# Altium schematic symbol library jlcpcb_2025_04_capacitors_extended_0805.schlib: 3281 symbols (part 14 of 18) (continued)
## FV21X472K102ECG
designator C?  Capacitance: 4.7nF  (hidden comment: *)
Capacitor, Ceramic (MLCC), 4.7nF, ±10%, 1kV, X7R, ±10%, SMD 0805; Manufacturer: PSA(Prosperity Dielectrics); Manufacturer Part Number: FV21X472K102ECG; Package Size: 0805; JLCPCB Basic Part: No; JLCPCB Part Number: C565695; Supplier 1: LCSC; Category: Capacitors - MLCC; Supplier Part Number 1: C565695; Tolerance: ±10%; Voltage Rating: 1kV; Temperature Coefficient: X7R; RoHS: Yes; ComponentLink1Description: Datasheet; ComponentLink1URL: https://wmsc.lcsc.com/wmsc/upload/file/pdf/v2/lcsc/2304140030_PSA-Prosperity-Dielectrics-FV21X472K102ECG_C565695.pdf; ComponentLink2Description: JLCPCB Part URL; ComponentLink2URL: https://jlcpcb.com/partdetail/C565695; ComponentLink3Description: LCSC Part URL; ComponentLink3URL: https://lcsc.com/product-detail/Multilayer-Ceramic-Capacitors-MLCC---SMD-SMT_PSAProsperity-Dielectrics-PSAProsperity-Dielectrics-FV21X472K102ECG_C565695.html
footprint CAP-0805 (0805 (2012M) Capacitor)
pins: 1, 2

## GCD21BR71H104KA01L
designator C?  Capacitance: 100nF  (hidden comment: *)
Capacitor, Ceramic (MLCC), 100nF, ±10%, null, X7R, ±10%, SMD 0805; Manufacturer: Murata Electronics; Manufacturer Part Number: GCD21BR71H104KA01L; Package Size: 0805; JLCPCB Basic Part: No; JLCPCB Part Number: C882587; Supplier 1: LCSC; Category: Capacitors - MLCC; Supplier Part Number 1: C882587; Tolerance: ±10%; Voltage Rating: null; Temperature Coefficient: X7R; RoHS: Yes; ComponentLink1Description: Datasheet; ComponentLink1URL: https://wmsc.lcsc.com/wmsc/upload/file/pdf/v2/lcsc/2201242130_Murata-Electronics-GCD21BR71H104KA01L_C882587.pdf; ComponentLink2Description: JLCPCB Part URL; ComponentLink2URL: https://jlcpcb.com/partdetail/C882587; ComponentLink3Description: LCSC Part URL; ComponentLink3URL: https://lcsc.com/product-detail/Multilayer-Ceramic-Capacitors-MLCC---SMD-SMT_Murata-Electronics-Murata-Electronics-GCD21BR71H104KA01L_C882587.html
footprint CAP-0805 (0805 (2012M) Capacitor)
pins: 1, 2

## GCD21BR72A104KA01L
designator C?  Capacitance: 100nF  (hidden comment: *)
Capacitor, Ceramic (MLCC), 100nF, ±10%, 100V, X7R, ±10%, SMD 0805; Manufacturer: Murata Electronics; Manufacturer Part Number: GCD21BR72A104KA01L; Package Size: 0805; JLCPCB Basic Part: No; JLCPCB Part Number: C2169476; Supplier 1: LCSC; Category: Capacitors - MLCC; Supplier Part Number 1: C2169476; Tolerance: ±10%; Voltage Rating: 100V; Temperature Coefficient: X7R; RoHS: Yes; ComponentLink1Description: Datasheet; ComponentLink1URL: https://wmsc.lcsc.com/wmsc/upload/file/pdf/v2/lcsc/2202040400_Murata-Electronics-GCD21BR72A104KA01L_C2169476.pdf; ComponentLink2Description: JLCPCB Part URL; ComponentLink2URL: https://jlcpcb.com/partdetail/C2169476; ComponentLink3Description: LCSC Part URL; ComponentLink3URL: https://lcsc.com/product-detail/Multilayer-Ceramic-Capacitors-MLCC---SMD-SMT_Murata-Electronics-Murata-Electronics-GCD21BR72A104KA01L_C2169476.html
footprint CAP-0805 (0805 (2012M) Capacitor)
pins: 1, 2

## GCG219R91H223KA03D
designator C?  Capacitance: 22nF  (hidden comment: *)
Capacitor, Ceramic (MLCC), 22nF, ±10%, 50V, X8R, ±10%, SMD 0805; Manufacturer: Murata Electronics; Manufacturer Part Number: GCG219R91H223KA03D; Package Size: 0805; JLCPCB Basic Part: No; JLCPCB Part Number: C161111; Supplier 1: LCSC; Category: Capacitors - MLCC; Supplier Part Number 1: C161111; Tolerance: ±10%; Voltage Rating: 50V; Temperature Coefficient: X8R; RoHS: Yes; ComponentLink1Description: Datasheet; ComponentLink1URL: https://wmsc.lcsc.com/wmsc/upload/file/pdf/v2/lcsc/1810201330_Murata-Electronics-GCG219R91H223KA03D_C161111.pdf; ComponentLink2Description: JLCPCB Part URL; ComponentLink2URL: https://jlcpcb.com/partdetail/C161111; ComponentLink3Description: LCSC Part URL; ComponentLink3URL: https://lcsc.com/product-detail/Multilayer-Ceramic-Capacitors-MLCC---SMD-SMT_Murata-Electronics-Murata-Electronics-GCG219R91H223KA03D_C161111.html
footprint CAP-0805 (0805 (2012M) Capacitor)
pins: 1, 2

## GCJ21AR72E472KXJ1D
designator C?  Capacitance: 4.7nF  (hidden comment: *)
Capacitor, Ceramic (MLCC), 4.7nF, ±10%, 250V, X7R, ±10%, SMD 0805; Manufacturer: Murata Electronics; Manufacturer Part Number: GCJ21AR72E472KXJ1D; Package Size: 0805; JLCPCB Basic Part: No; JLCPCB Part Number: C710625; Supplier 1: LCSC; Category: Capacitors - MLCC; Supplier Part Number 1: C710625; Tolerance: ±10%; Voltage Rating: 250V; Temperature Coefficient: X7R; RoHS: Yes; ComponentLink1Description: Datasheet; ComponentLink1URL: https://wmsc.lcsc.com/wmsc/upload/file/pdf/v2/lcsc/2206301900_Murata-Electronics-GCJ21AR72E472KXJ1D_C710625.pdf; ComponentLink2Description: JLCPCB Part URL; ComponentLink2URL: https://jlcpcb.com/partdetail/C710625; ComponentLink3Description: LCSC Part URL; ComponentLink3URL: https://lcsc.com/product-detail/Multilayer-Ceramic-Capacitors-MLCC---SMD-SMT_Murata-Electronics-Murata-Electronics-GCJ21AR72E472KXJ1D_C710625.html
footprint CAP-0805 (0805 (2012M) Capacitor)
pins: 1, 2

## GCJ21BC72A105KE02L
designator C?  Capacitance: 1uF  (hidden comment: *)
Capacitor, Ceramic (MLCC), 1uF, ±10%, 100V, X7S, ±10%, SMD 0805; Manufacturer: Murata Electronics; Manufacturer Part Number: GCJ21BC72A105KE02L; Package Size: 0805; JLCPCB Basic Part: No; JLCPCB Part Number: C524548; Supplier 1: LCSC; Category: Capacitors - MLCC; Supplier Part Number 1: C524548; Tolerance: ±10%; Voltage Rating: 100V; Temperature Coefficient: X7S; RoHS: Yes; ComponentLink1Description: Datasheet; ComponentLink1URL: https://wmsc.lcsc.com/wmsc/upload/file/pdf/v2/lcsc/2007231106_Murata-Electronics-GCJ21BC72A105KE02L_C524548.pdf; ComponentLink2Description: JLCPCB Part URL; ComponentLink2URL: https://jlcpcb.com/partdetail/C524548; ComponentLink3Description: LCSC Part URL; ComponentLink3URL: https://lcsc.com/product-detail/Multilayer-Ceramic-Capacitors-MLCC---SMD-SMT_Murata-Electronics-Murata-Electronics-GCJ21BC72A105KE02L_C524548.html
footprint CAP-0805 (0805 (2012M) Capacitor)
pins: 1, 2

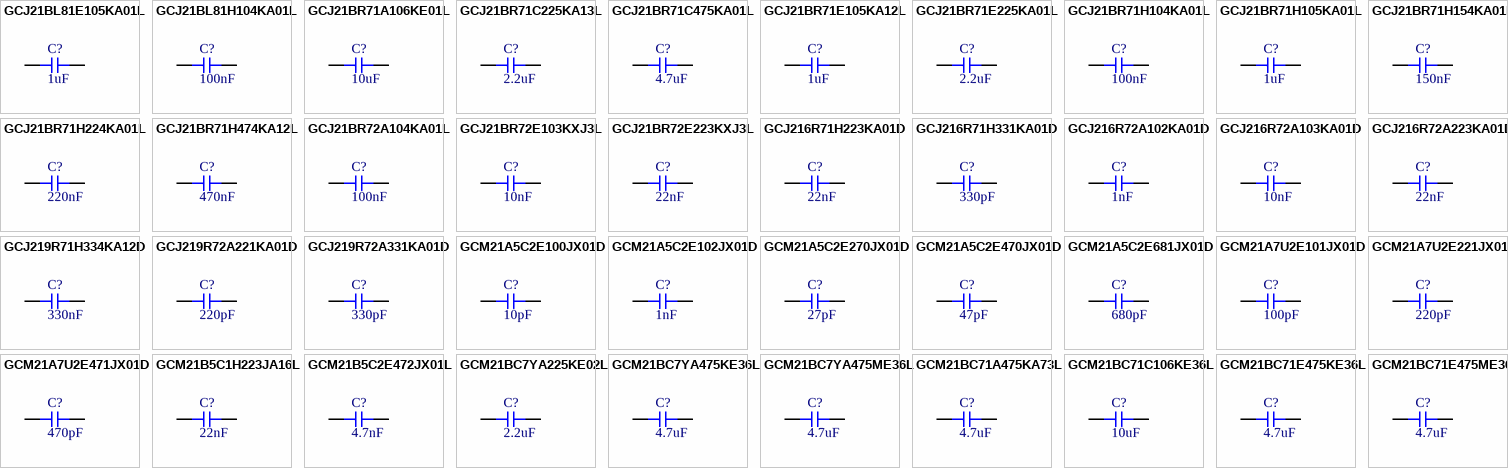
[diagram p61: symbols GCJ21BL81E105KA01L to GCM21BC71E475ME36L]

## GCJ21BL81E105KA01L
designator C?  Capacitance: 1uF  (hidden comment: *)
Capacitor, Ceramic (MLCC), 1uF, ±10%, 25V, ±10%, SMD 0805; Manufacturer: Murata Electronics; Manufacturer Part Number: GCJ21BL81E105KA01L; Package Size: 0805; JLCPCB Basic Part: No; JLCPCB Part Number: C2167286; Supplier 1: LCSC; Category: Capacitors - MLCC; Supplier Part Number 1: C2167286; Tolerance: ±10%; Voltage Rating: 25V; RoHS: Yes; ComponentLink1Description: Datasheet; ComponentLink1URL: https://wmsc.lcsc.com/wmsc/upload/file/pdf/v2/lcsc/2202040230_Murata-Electronics-GCJ21BL81E105KA01L_C2167286.pdf; ComponentLink2Description: JLCPCB Part URL; ComponentLink2URL: https://jlcpcb.com/partdetail/C2167286; ComponentLink3Description: LCSC Part URL; ComponentLink3URL: https://lcsc.com/product-detail/Multilayer-Ceramic-Capacitors-MLCC---SMD-SMT_Murata-Electronics-Murata-Electronics-GCJ21BL81E105KA01L_C2167286.html
footprint CAP-0805 (0805 (2012M) Capacitor)
pins: 1, 2

## GCJ21BL81H104KA01L
designator C?  Capacitance: 100nF  (hidden comment: *)
Capacitor, Ceramic (MLCC), 100nF, ±10%, 50V, X8L, ±10%, SMD 0805; Manufacturer: Murata Electronics; Manufacturer Part Number: GCJ21BL81H104KA01L; Package Size: 0805; JLCPCB Basic Part: No; JLCPCB Part Number: C710626; Supplier 1: LCSC; Category: Capacitors - MLCC; Supplier Part Number 1: C710626; Tolerance: ±10%; Voltage Rating: 50V; Temperature Coefficient: X8L; RoHS: Yes; ComponentLink1Description: Datasheet; ComponentLink1URL: https://wmsc.lcsc.com/wmsc/upload/file/pdf/v2/lcsc/2210190600_Murata-Electronics-GCJ21BL81H104KA01L_C710626.pdf; ComponentLink2Description: JLCPCB Part URL; ComponentLink2URL: https://jlcpcb.com/partdetail/C710626; ComponentLink3Description: LCSC Part URL; ComponentLink3URL: https://lcsc.com/product-detail/Multilayer-Ceramic-Capacitors-MLCC---SMD-SMT_Murata-Electronics-Murata-Electronics-GCJ21BL81H104KA01L_C710626.html
footprint CAP-0805 (0805 (2012M) Capacitor)
pins: 1, 2

## GCJ21BR71A106KE01L
designator C?  Capacitance: 10uF  (hidden comment: *)
Capacitor, Ceramic (MLCC), 10uF, ±10%, 10V, X7R, ±10%, SMD 0805; Manufacturer: Murata Electronics; Manufacturer Part Number: GCJ21BR71A106KE01L; Package Size: 0805; JLCPCB Basic Part: No; JLCPCB Part Number: C441746; Supplier 1: LCSC; Category: Capacitors - MLCC; Supplier Part Number 1: C441746; Tolerance: ±10%; Voltage Rating: 10V; Temperature Coefficient: X7R; RoHS: Yes; ComponentLink1Description: Datasheet; ComponentLink1URL: https://wmsc.lcsc.com/wmsc/upload/file/pdf/v2/lcsc/2304140030_Murata-Electronics-GCJ21BR71A106KE01L_C441746.pdf; ComponentLink2Description: JLCPCB Part URL; ComponentLink2URL: https://jlcpcb.com/partdetail/C441746; ComponentLink3Description: LCSC Part URL; ComponentLink3URL: https://lcsc.com/product-detail/Multilayer-Ceramic-Capacitors-MLCC---SMD-SMT_Murata-Electronics-Murata-Electronics-GCJ21BR71A106KE01L_C441746.html
footprint CAP-0805 (0805 (2012M) Capacitor)
pins: 1, 2

## GCJ21BR71C225KA13L
designator C?  Capacitance: 2.2uF  (hidden comment: *)
Capacitor, Ceramic (MLCC), 2.2uF, ±10%, 16V, X7R, ±10%, SMD 0805; Manufacturer: Murata Electronics; Manufacturer Part Number: GCJ21BR71C225KA13L; Package Size: 0805; JLCPCB Basic Part: No; JLCPCB Part Number: C354371; Supplier 1: LCSC; Category: Capacitors - MLCC; Supplier Part Number 1: C354371; Tolerance: ±10%; Voltage Rating: 16V; Temperature Coefficient: X7R; RoHS: Yes; ComponentLink1Description: Datasheet; ComponentLink1URL: https://wmsc.lcsc.com/wmsc/upload/file/pdf/v2/lcsc/1912111437_Murata-Electronics-GCJ21BR71C225KA13L_C354371.pdf; ComponentLink2Description: JLCPCB Part URL; ComponentLink2URL: https://jlcpcb.com/partdetail/C354371; ComponentLink3Description: LCSC Part URL; ComponentLink3URL: https://lcsc.com/product-detail/Multilayer-Ceramic-Capacitors-MLCC---SMD-SMT_Murata-Electronics-Murata-Electronics-GCJ21BR71C225KA13L_C354371.html
footprint CAP-0805 (0805 (2012M) Capacitor)
pins: 1, 2

## GCJ21BR71C475KA01L
designator C?  Capacitance: 4.7uF  (hidden comment: *)
Capacitor, Ceramic (MLCC), 4.7uF, ±10%, 16V, X7R, ±10%, SMD 0805; Manufacturer: Murata Electronics; Manufacturer Part Number: GCJ21BR71C475KA01L; Package Size: 0805; JLCPCB Basic Part: No; JLCPCB Part Number: C161119; Supplier 1: LCSC; Category: Capacitors - MLCC; Supplier Part Number 1: C161119; Tolerance: ±10%; Voltage Rating: 16V; Temperature Coefficient: X7R; RoHS: Yes; ComponentLink1Description: Datasheet; ComponentLink1URL: https://wmsc.lcsc.com/wmsc/upload/file/pdf/v2/lcsc/1810201330_Murata-Electronics-GCJ21BR71C475KA01L_C161119.pdf; ComponentLink2Description: JLCPCB Part URL; ComponentLink2URL: https://jlcpcb.com/partdetail/C161119; ComponentLink3Description: LCSC Part URL; ComponentLink3URL: https://lcsc.com/product-detail/Multilayer-Ceramic-Capacitors-MLCC---SMD-SMT_Murata-Electronics-Murata-Electronics-GCJ21BR71C475KA01L_C161119.html
footprint CAP-0805 (0805 (2012M) Capacitor)
pins: 1, 2

## GCJ21BR71E105KA12L
designator C?  Capacitance: 1uF  (hidden comment: *)
Capacitor, Ceramic (MLCC), 1uF, ±10%, 25V, X7R, ±10%, SMD 0805; Manufacturer: Murata Electronics; Manufacturer Part Number: GCJ21BR71E105KA12L; Package Size: 0805; JLCPCB Basic Part: No; JLCPCB Part Number: C354370; Supplier 1: LCSC; Category: Capacitors - MLCC; Supplier Part Number 1: C354370; Tolerance: ±10%; Voltage Rating: 25V; Temperature Coefficient: X7R; RoHS: Yes; ComponentLink1Description: Datasheet; ComponentLink1URL: https://wmsc.lcsc.com/wmsc/upload/file/pdf/v2/lcsc/1912111437_Murata-Electronics-GCJ21BR71E105KA12L_C354370.pdf; ComponentLink2Description: JLCPCB Part URL; ComponentLink2URL: https://jlcpcb.com/partdetail/C354370; ComponentLink3Description: LCSC Part URL; ComponentLink3URL: https://lcsc.com/product-detail/Multilayer-Ceramic-Capacitors-MLCC---SMD-SMT_Murata-Electronics-Murata-Electronics-GCJ21BR71E105KA12L_C354370.html
footprint CAP-0805 (0805 (2012M) Capacitor)
pins: 1, 2

## GCJ21BR71E225KA01L
designator C?  Capacitance: 2.2uF  (hidden comment: *)
Capacitor, Ceramic (MLCC), 2.2uF, ±10%, 25V, X7R, ±10%, SMD 0805; Manufacturer: Murata Electronics; Manufacturer Part Number: GCJ21BR71E225KA01L; Package Size: 0805; JLCPCB Basic Part: No; JLCPCB Part Number: C782033; Supplier 1: LCSC; Category: Capacitors - MLCC; Supplier Part Number 1: C782033; Tolerance: ±10%; Voltage Rating: 25V; Temperature Coefficient: X7R; RoHS: Yes; ComponentLink1Description: Datasheet; ComponentLink1URL: https://wmsc.lcsc.com/wmsc/upload/file/pdf/v2/lcsc/2010281406_Murata-Electronics-GCJ21BR71E225KA01L_C782033.pdf; ComponentLink2Description: JLCPCB Part URL; ComponentLink2URL: https://jlcpcb.com/partdetail/C782033; ComponentLink3Description: LCSC Part URL; ComponentLink3URL: https://lcsc.com/product-detail/Multilayer-Ceramic-Capacitors-MLCC---SMD-SMT_Murata-Electronics-Murata-Electronics-GCJ21BR71E225KA01L_C782033.html
footprint CAP-0805 (0805 (2012M) Capacitor)
pins: 1, 2

## GCJ21BR71H104KA01L
designator C?  Capacitance: 100nF  (hidden comment: *)
Capacitor, Ceramic (MLCC), 100nF, ±10%, 50V, X7R, ±10%, SMD 0805; Manufacturer: Murata Electronics; Manufacturer Part Number: GCJ21BR71H104KA01L; Package Size: 0805; JLCPCB Basic Part: No; JLCPCB Part Number: C354369; Supplier 1: LCSC; Category: Capacitors - MLCC; Supplier Part Number 1: C354369; Tolerance: ±10%; Voltage Rating: 50V; Temperature Coefficient: X7R; RoHS: Yes; ComponentLink1Description: Datasheet; ComponentLink1URL: https://wmsc.lcsc.com/wmsc/upload/file/pdf/v2/lcsc/1912111437_Murata-Electronics-GCJ21BR71H104KA01L_C354369.pdf; ComponentLink2Description: JLCPCB Part URL; ComponentLink2URL: https://jlcpcb.com/partdetail/C354369; ComponentLink3Description: LCSC Part URL; ComponentLink3URL: https://lcsc.com/product-detail/Multilayer-Ceramic-Capacitors-MLCC---SMD-SMT_Murata-Electronics-Murata-Electronics-GCJ21BR71H104KA01L_C354369.html
footprint CAP-0805 (0805 (2012M) Capacitor)
pins: 1, 2

## GCJ21BR71H105KA01L
designator C?  Capacitance: 1uF  (hidden comment: *)
Capacitor, Ceramic (MLCC), 1uF, ±10%, 50V, X7R, ±10%, SMD 0805; Manufacturer: Murata Electronics; Manufacturer Part Number: GCJ21BR71H105KA01L; Package Size: 0805; JLCPCB Basic Part: No; JLCPCB Part Number: C354368; Supplier 1: LCSC; Category: Capacitors - MLCC; Supplier Part Number 1: C354368; Tolerance: ±10%; Voltage Rating: 50V; Temperature Coefficient: X7R; RoHS: Yes; ComponentLink1Description: Datasheet; ComponentLink1URL: https://wmsc.lcsc.com/wmsc/upload/file/pdf/v2/lcsc/1912111437_Murata-Electronics-GCJ21BR71H105KA01L_C354368.pdf; ComponentLink2Description: JLCPCB Part URL; ComponentLink2URL: https://jlcpcb.com/partdetail/C354368; ComponentLink3Description: LCSC Part URL; ComponentLink3URL: https://lcsc.com/product-detail/Multilayer-Ceramic-Capacitors-MLCC---SMD-SMT_Murata-Electronics-Murata-Electronics-GCJ21BR71H105KA01L_C354368.html
footprint CAP-0805 (0805 (2012M) Capacitor)
pins: 1, 2

## GCJ21BR71H154KA01L
designator C?  Capacitance: 150nF  (hidden comment: *)
Capacitor, Ceramic (MLCC), 150nF, ±10%, 50V, X7R, ±10%, SMD 0805; Manufacturer: Murata Electronics; Manufacturer Part Number: GCJ21BR71H154KA01L; Package Size: 0805; JLCPCB Basic Part: No; JLCPCB Part Number: C354367; Supplier 1: LCSC; Category: Capacitors - MLCC; Supplier Part Number 1: C354367; Tolerance: ±10%; Voltage Rating: 50V; Temperature Coefficient: X7R; RoHS: Yes; ComponentLink1Description: Datasheet; ComponentLink1URL: https://wmsc.lcsc.com/wmsc/upload/file/pdf/v2/lcsc/1912111437_Murata-Electronics-GCJ21BR71H154KA01L_C354367.pdf; ComponentLink2Description: JLCPCB Part URL; ComponentLink2URL: https://jlcpcb.com/partdetail/C354367; ComponentLink3Description: LCSC Part URL; ComponentLink3URL: https://lcsc.com/product-detail/Multilayer-Ceramic-Capacitors-MLCC---SMD-SMT_Murata-Electronics-Murata-Electronics-GCJ21BR71H154KA01L_C354367.html
footprint CAP-0805 (0805 (2012M) Capacitor)
pins: 1, 2

## GCJ21BR71H224KA01L
designator C?  Capacitance: 220nF  (hidden comment: *)
Capacitor, Ceramic (MLCC), 220nF, ±10%, 50V, X7R, ±10%, SMD 0805; Manufacturer: Murata Electronics; Manufacturer Part Number: GCJ21BR71H224KA01L; Package Size: 0805; JLCPCB Basic Part: No; JLCPCB Part Number: C354366; Supplier 1: LCSC; Category: Capacitors - MLCC; Supplier Part Number 1: C354366; Tolerance: ±10%; Voltage Rating: 50V; Temperature Coefficient: X7R; RoHS: Yes; ComponentLink1Description: Datasheet; ComponentLink1URL: https://wmsc.lcsc.com/wmsc/upload/file/pdf/v2/lcsc/1912111437_Murata-Electronics-GCJ21BR71H224KA01L_C354366.pdf; ComponentLink2Description: JLCPCB Part URL; ComponentLink2URL: https://jlcpcb.com/partdetail/C354366; ComponentLink3Description: LCSC Part URL; ComponentLink3URL: https://lcsc.com/product-detail/Multilayer-Ceramic-Capacitors-MLCC---SMD-SMT_Murata-Electronics-Murata-Electronics-GCJ21BR71H224KA01L_C354366.html
footprint CAP-0805 (0805 (2012M) Capacitor)
pins: 1, 2

## GCJ21BR71H474KA12L
designator C?  Capacitance: 470nF  (hidden comment: *)
Capacitor, Ceramic (MLCC), 470nF, ±10%, 50V, X7R, ±10%, SMD 0805; Manufacturer: Murata Electronics; Manufacturer Part Number: GCJ21BR71H474KA12L; Package Size: 0805; JLCPCB Basic Part: No; JLCPCB Part Number: C441756; Supplier 1: LCSC; Category: Capacitors - MLCC; Supplier Part Number 1: C441756; Tolerance: ±10%; Voltage Rating: 50V; Temperature Coefficient: X7R; RoHS: Yes; ComponentLink1Description: Datasheet; ComponentLink1URL: https://wmsc.lcsc.com/wmsc/upload/file/pdf/v2/lcsc/2304140030_Murata-Electronics-GCJ21BR71H474KA12L_C441756.pdf; ComponentLink2Description: JLCPCB Part URL; ComponentLink2URL: https://jlcpcb.com/partdetail/C441756; ComponentLink3Description: LCSC Part URL; ComponentLink3URL: https://lcsc.com/product-detail/Multilayer-Ceramic-Capacitors-MLCC---SMD-SMT_Murata-Electronics-Murata-Electronics-GCJ21BR71H474KA12L_C441756.html
footprint CAP-0805 (0805 (2012M) Capacitor)
pins: 1, 2

## GCJ21BR72A104KA01L
designator C?  Capacitance: 100nF  (hidden comment: *)
Capacitor, Ceramic (MLCC), 100nF, ±10%, 100V, X7R, ±10%, SMD 0805; Manufacturer: Murata Electronics; Manufacturer Part Number: GCJ21BR72A104KA01L; Package Size: 0805; JLCPCB Basic Part: No; JLCPCB Part Number: C354365; Supplier 1: LCSC; Category: Capacitors - MLCC; Supplier Part Number 1: C354365; Tolerance: ±10%; Voltage Rating: 100V; Temperature Coefficient: X7R; RoHS: Yes; ComponentLink1Description: Datasheet; ComponentLink1URL: https://wmsc.lcsc.com/wmsc/upload/file/pdf/v2/lcsc/2304140030_Murata-Electronics-GCJ21BR72A104KA01L_C354365.pdf; ComponentLink2Description: JLCPCB Part URL; ComponentLink2URL: https://jlcpcb.com/partdetail/C354365; ComponentLink3Description: LCSC Part URL; ComponentLink3URL: https://lcsc.com/product-detail/Multilayer-Ceramic-Capacitors-MLCC---SMD-SMT_Murata-Electronics-Murata-Electronics-GCJ21BR72A104KA01L_C354365.html
footprint CAP-0805 (0805 (2012M) Capacitor)
pins: 1, 2

## GCJ21BR72E103KXJ3L
designator C?  Capacitance: 10nF  (hidden comment: *)
Capacitor, Ceramic (MLCC), 10nF, ±10%, 250V, X7R, ±10%, SMD 0805; Manufacturer: Murata Electronics; Manufacturer Part Number: GCJ21BR72E103KXJ3L; Package Size: 0805; JLCPCB Basic Part: No; JLCPCB Part Number: C417148; Supplier 1: LCSC; Category: Capacitors - MLCC; Supplier Part Number 1: C417148; Tolerance: ±10%; Voltage Rating: 250V; Temperature Coefficient: X7R; RoHS: Yes; ComponentLink1Description: Datasheet; ComponentLink1URL: https://wmsc.lcsc.com/wmsc/upload/file/pdf/v2/lcsc/2007231102_Murata-Electronics-GCJ21BR72E103KXJ3L_C417148.pdf; ComponentLink2Description: JLCPCB Part URL; ComponentLink2URL: https://jlcpcb.com/partdetail/C417148; ComponentLink3Description: LCSC Part URL; ComponentLink3URL: https://lcsc.com/product-detail/Multilayer-Ceramic-Capacitors-MLCC---SMD-SMT_Murata-Electronics-Murata-Electronics-GCJ21BR72E103KXJ3L_C417148.html
footprint CAP-0805 (0805 (2012M) Capacitor)
pins: 1, 2

## GCJ21BR72E223KXJ3L
designator C?  Capacitance: 22nF  (hidden comment: *)
Capacitor, Ceramic (MLCC), 22nF, ±10%, 250V, X7R, ±10%, SMD 0805; Manufacturer: Murata Electronics; Manufacturer Part Number: GCJ21BR72E223KXJ3L; Package Size: 0805; JLCPCB Basic Part: No; JLCPCB Part Number: C527982; Supplier 1: LCSC; Category: Capacitors - MLCC; Supplier Part Number 1: C527982; Tolerance: ±10%; Voltage Rating: 250V; Temperature Coefficient: X7R; RoHS: Yes; ComponentLink1Description: Datasheet; ComponentLink1URL: https://wmsc.lcsc.com/wmsc/upload/file/pdf/v2/lcsc/2008131233_Murata-Electronics-GCJ21BR72E223KXJ3L_C527982.pdf; ComponentLink2Description: JLCPCB Part URL; ComponentLink2URL: https://jlcpcb.com/partdetail/C527982; ComponentLink3Description: LCSC Part URL; ComponentLink3URL: https://lcsc.com/product-detail/Multilayer-Ceramic-Capacitors-MLCC---SMD-SMT_Murata-Electronics-Murata-Electronics-GCJ21BR72E223KXJ3L_C527982.html
footprint CAP-0805 (0805 (2012M) Capacitor)
pins: 1, 2

## GCJ216R71H223KA01D
designator C?  Capacitance: 22nF  (hidden comment: *)
Capacitor, Ceramic (MLCC), 22nF, ±10%, 50V, X7R, ±10%, SMD 0805; Manufacturer: Murata Electronics; Manufacturer Part Number: GCJ216R71H223KA01D; Package Size: 0805; JLCPCB Basic Part: No; JLCPCB Part Number: C354379; Supplier 1: LCSC; Category: Capacitors - MLCC; Supplier Part Number 1: C354379; Tolerance: ±10%; Voltage Rating: 50V; Temperature Coefficient: X7R; RoHS: Yes; ComponentLink1Description: Datasheet; ComponentLink1URL: https://wmsc.lcsc.com/wmsc/upload/file/pdf/v2/lcsc/1912111437_Murata-Electronics-GCJ216R71H223KA01D_C354379.pdf; ComponentLink2Description: JLCPCB Part URL; ComponentLink2URL: https://jlcpcb.com/partdetail/C354379; ComponentLink3Description: LCSC Part URL; ComponentLink3URL: https://lcsc.com/product-detail/Multilayer-Ceramic-Capacitors-MLCC---SMD-SMT_Murata-Electronics-Murata-Electronics-GCJ216R71H223KA01D_C354379.html
footprint CAP-0805 (0805 (2012M) Capacitor)
pins: 1, 2

## GCJ216R71H331KA01D
designator C?  Capacitance: 330pF  (hidden comment: *)
Capacitor, Ceramic (MLCC), 330pF, ±10%, 50V, X7R, ±10%, SMD 0805; Manufacturer: Murata Electronics; Manufacturer Part Number: GCJ216R71H331KA01D; Package Size: 0805; JLCPCB Basic Part: No; JLCPCB Part Number: C354378; Supplier 1: LCSC; Category: Capacitors - MLCC; Supplier Part Number 1: C354378; Tolerance: ±10%; Voltage Rating: 50V; Temperature Coefficient: X7R; RoHS: Yes; ComponentLink1Description: Datasheet; ComponentLink1URL: https://wmsc.lcsc.com/wmsc/upload/file/pdf/v2/lcsc/1912111437_Murata-Electronics-GCJ216R71H331KA01D_C354378.pdf; ComponentLink2Description: JLCPCB Part URL; ComponentLink2URL: https://jlcpcb.com/partdetail/C354378; ComponentLink3Description: LCSC Part URL; ComponentLink3URL: https://lcsc.com/product-detail/Multilayer-Ceramic-Capacitors-MLCC---SMD-SMT_Murata-Electronics-Murata-Electronics-GCJ216R71H331KA01D_C354378.html
footprint CAP-0805 (0805 (2012M) Capacitor)
pins: 1, 2

## GCJ216R72A102KA01D
designator C?  Capacitance: 1nF  (hidden comment: *)
Capacitor, Ceramic (MLCC), 1nF, ±10%, 100V, X7R, ±10%, SMD 0805; Manufacturer: Murata Electronics; Manufacturer Part Number: GCJ216R72A102KA01D; Package Size: 0805; JLCPCB Basic Part: No; JLCPCB Part Number: C354376; Supplier 1: LCSC; Category: Capacitors - MLCC; Supplier Part Number 1: C354376; Tolerance: ±10%; Voltage Rating: 100V; Temperature Coefficient: X7R; RoHS: Yes; ComponentLink1Description: Datasheet; ComponentLink1URL: https://wmsc.lcsc.com/wmsc/upload/file/pdf/v2/lcsc/1912111437_Murata-Electronics-GCJ216R72A102KA01D_C354376.pdf; ComponentLink2Description: JLCPCB Part URL; ComponentLink2URL: https://jlcpcb.com/partdetail/C354376; ComponentLink3Description: LCSC Part URL; ComponentLink3URL: https://lcsc.com/product-detail/Multilayer-Ceramic-Capacitors-MLCC---SMD-SMT_Murata-Electronics-Murata-Electronics-GCJ216R72A102KA01D_C354376.html
footprint CAP-0805 (0805 (2012M) Capacitor)
pins: 1, 2

## GCJ216R72A103KA01D
designator C?  Capacitance: 10nF  (hidden comment: *)
Capacitor, Ceramic (MLCC), 10nF, ±10%, 100V, X7R, ±10%, SMD 0805; Manufacturer: Murata Electronics; Manufacturer Part Number: GCJ216R72A103KA01D; Package Size: 0805; JLCPCB Basic Part: No; JLCPCB Part Number: C354375; Supplier 1: LCSC; Category: Capacitors - MLCC; Supplier Part Number 1: C354375; Tolerance: ±10%; Voltage Rating: 100V; Temperature Coefficient: X7R; RoHS: Yes; ComponentLink1Description: Datasheet; ComponentLink1URL: https://wmsc.lcsc.com/wmsc/upload/file/pdf/v2/lcsc/1912111437_Murata-Electronics-GCJ216R72A103KA01D_C354375.pdf; ComponentLink2Description: JLCPCB Part URL; ComponentLink2URL: https://jlcpcb.com/partdetail/C354375; ComponentLink3Description: LCSC Part URL; ComponentLink3URL: https://lcsc.com/product-detail/Multilayer-Ceramic-Capacitors-MLCC---SMD-SMT_Murata-Electronics-Murata-Electronics-GCJ216R72A103KA01D_C354375.html
footprint CAP-0805 (0805 (2012M) Capacitor)
pins: 1, 2

## GCJ216R72A223KA01D
designator C?  Capacitance: 22nF  (hidden comment: *)
Capacitor, Ceramic (MLCC), 22nF, ±10%, 100V, X7R, ±10%, SMD 0805; Manufacturer: Murata Electronics; Manufacturer Part Number: GCJ216R72A223KA01D; Package Size: 0805; JLCPCB Basic Part: No; JLCPCB Part Number: C354374; Supplier 1: LCSC; Category: Capacitors - MLCC; Supplier Part Number 1: C354374; Tolerance: ±10%; Voltage Rating: 100V; Temperature Coefficient: X7R; RoHS: Yes; ComponentLink1Description: Datasheet; ComponentLink1URL: https://wmsc.lcsc.com/wmsc/upload/file/pdf/v2/lcsc/1912111437_Murata-Electronics-GCJ216R72A223KA01D_C354374.pdf; ComponentLink2Description: JLCPCB Part URL; ComponentLink2URL: https://jlcpcb.com/partdetail/C354374; ComponentLink3Description: LCSC Part URL; ComponentLink3URL: https://lcsc.com/product-detail/Multilayer-Ceramic-Capacitors-MLCC---SMD-SMT_Murata-Electronics-Murata-Electronics-GCJ216R72A223KA01D_C354374.html
footprint CAP-0805 (0805 (2012M) Capacitor)
pins: 1, 2

## GCJ219R71H334KA12D
designator C?  Capacitance: 330nF  (hidden comment: *)
Capacitor, Ceramic (MLCC), 330nF, ±10%, 50V, X7R, ±10%, SMD 0805; Manufacturer: Murata Electronics; Manufacturer Part Number: GCJ219R71H334KA12D; Package Size: 0805; JLCPCB Basic Part: No; JLCPCB Part Number: C527609; Supplier 1: LCSC; Category: Capacitors - MLCC; Supplier Part Number 1: C527609; Tolerance: ±10%; Voltage Rating: 50V; Temperature Coefficient: X7R; RoHS: Yes; ComponentLink1Description: Datasheet; ComponentLink1URL: https://wmsc.lcsc.com/wmsc/upload/file/pdf/v2/lcsc/2007231106_Murata-Electronics-GCJ219R71H334KA12D_C527609.pdf; ComponentLink2Description: JLCPCB Part URL; ComponentLink2URL: https://jlcpcb.com/partdetail/C527609; ComponentLink3Description: LCSC Part URL; ComponentLink3URL: https://lcsc.com/product-detail/Multilayer-Ceramic-Capacitors-MLCC---SMD-SMT_Murata-Electronics-Murata-Electronics-GCJ219R71H334KA12D_C527609.html
footprint CAP-0805 (0805 (2012M) Capacitor)
pins: 1, 2

## GCJ219R72A221KA01D
designator C?  Capacitance: 220pF  (hidden comment: *)
Capacitor, Ceramic (MLCC), 220pF, ±10%, 100V, X7R, ±10%, SMD 0805; Manufacturer: Murata Electronics; Manufacturer Part Number: GCJ219R72A221KA01D; Package Size: 0805; JLCPCB Basic Part: No; JLCPCB Part Number: C354373; Supplier 1: LCSC; Category: Capacitors - MLCC; Supplier Part Number 1: C354373; Tolerance: ±10%; Voltage Rating: 100V; Temperature Coefficient: X7R; RoHS: Yes; ComponentLink1Description: Datasheet; ComponentLink1URL: https://wmsc.lcsc.com/wmsc/upload/file/pdf/v2/lcsc/1912111437_Murata-Electronics-GCJ219R72A221KA01D_C354373.pdf; ComponentLink2Description: JLCPCB Part URL; ComponentLink2URL: https://jlcpcb.com/partdetail/C354373; ComponentLink3Description: LCSC Part URL; ComponentLink3URL: https://lcsc.com/product-detail/Multilayer-Ceramic-Capacitors-MLCC---SMD-SMT_Murata-Electronics-Murata-Electronics-GCJ219R72A221KA01D_C354373.html
footprint CAP-0805 (0805 (2012M) Capacitor)
pins: 1, 2

## GCJ219R72A331KA01D
designator C?  Capacitance: 330pF  (hidden comment: *)
Capacitor, Ceramic (MLCC), 330pF, ±10%, 100V, X7R, ±10%, SMD 0805; Manufacturer: Murata Electronics; Manufacturer Part Number: GCJ219R72A331KA01D; Package Size: 0805; JLCPCB Basic Part: No; JLCPCB Part Number: C354372; Supplier 1: LCSC; Category: Capacitors - MLCC; Supplier Part Number 1: C354372; Tolerance: ±10%; Voltage Rating: 100V; Temperature Coefficient: X7R; RoHS: Yes; ComponentLink1Description: Datasheet; ComponentLink1URL: https://wmsc.lcsc.com/wmsc/upload/file/pdf/v2/lcsc/1912111437_Murata-Electronics-GCJ219R72A331KA01D_C354372.pdf; ComponentLink2Description: JLCPCB Part URL; ComponentLink2URL: https://jlcpcb.com/partdetail/C354372; ComponentLink3Description: LCSC Part URL; ComponentLink3URL: https://lcsc.com/product-detail/Multilayer-Ceramic-Capacitors-MLCC---SMD-SMT_Murata-Electronics-Murata-Electronics-GCJ219R72A331KA01D_C354372.html
footprint CAP-0805 (0805 (2012M) Capacitor)
pins: 1, 2

## GCM21A5C2E100JX01D
designator C?  Capacitance: 10pF  (hidden comment: *)
Capacitor, Ceramic (MLCC), 10pF, ±5%, 250V, C0G, ±5%, SMD 0805; Manufacturer: Murata Electronics; Manufacturer Part Number: GCM21A5C2E100JX01D; Package Size: 0805; JLCPCB Basic Part: No; JLCPCB Part Number: C408553; Supplier 1: LCSC; Category: Capacitors - MLCC; Supplier Part Number 1: C408553; Tolerance: ±5%; Voltage Rating: 250V; Temperature Coefficient: C0G; RoHS: Yes; ComponentLink1Description: Datasheet; ComponentLink1URL: https://wmsc.lcsc.com/wmsc/upload/file/pdf/v2/lcsc/2304140030_Murata-Electronics-GCM21A5C2E100JX01D_C408553.pdf; ComponentLink2Description: JLCPCB Part URL; ComponentLink2URL: https://jlcpcb.com/partdetail/C408553; ComponentLink3Description: LCSC Part URL; ComponentLink3URL: https://lcsc.com/product-detail/Multilayer-Ceramic-Capacitors-MLCC---SMD-SMT_Murata-Electronics-Murata-Electronics-GCM21A5C2E100JX01D_C408553.html
footprint CAP-0805 (0805 (2012M) Capacitor)
pins: 1, 2

## GCM21A5C2E102JX01D
designator C?  Capacitance: 1nF  (hidden comment: *)
Capacitor, Ceramic (MLCC), 1nF, ±5%, 250V, C0G, ±5%, SMD 0805; Manufacturer: Murata Electronics; Manufacturer Part Number: GCM21A5C2E102JX01D; Package Size: 0805; JLCPCB Basic Part: No; JLCPCB Part Number: C408554; Supplier 1: LCSC; Category: Capacitors - MLCC; Supplier Part Number 1: C408554; Tolerance: ±5%; Voltage Rating: 250V; Temperature Coefficient: C0G; RoHS: Yes; ComponentLink1Description: Datasheet; ComponentLink1URL: https://wmsc.lcsc.com/wmsc/upload/file/pdf/v2/lcsc/2304140030_Murata-Electronics-GCM21A5C2E102JX01D_C408554.pdf; ComponentLink2Description: JLCPCB Part URL; ComponentLink2URL: https://jlcpcb.com/partdetail/C408554; ComponentLink3Description: LCSC Part URL; ComponentLink3URL: https://lcsc.com/product-detail/Multilayer-Ceramic-Capacitors-MLCC---SMD-SMT_Murata-Electronics-Murata-Electronics-GCM21A5C2E102JX01D_C408554.html
footprint CAP-0805 (0805 (2012M) Capacitor)
pins: 1, 2

## GCM21A5C2E270JX01D
designator C?  Capacitance: 27pF  (hidden comment: *)
Capacitor, Ceramic (MLCC), 27pF, ±5%, 250V, C0G, ±5%, SMD 0805; Manufacturer: Murata Electronics; Manufacturer Part Number: GCM21A5C2E270JX01D; Package Size: 0805; JLCPCB Basic Part: No; JLCPCB Part Number: C5119321; Supplier 1: LCSC; Category: Capacitors - MLCC; Supplier Part Number 1: C5119321; Tolerance: ±5%; Voltage Rating: 250V; Temperature Coefficient: C0G; RoHS: Yes; ComponentLink1Description: Datasheet; ComponentLink1URL: https://wmsc.lcsc.com/wmsc/upload/file/pdf/v2/lcsc/2207261030_Murata-Electronics-GCM21A5C2E270JX01D_C5119321.pdf; ComponentLink2Description: JLCPCB Part URL; ComponentLink2URL: https://jlcpcb.com/partdetail/C5119321; ComponentLink3Description: LCSC Part URL; ComponentLink3URL: https://lcsc.com/product-detail/Multilayer-Ceramic-Capacitors-MLCC---SMD-SMT_Murata-Electronics-Murata-Electronics-GCM21A5C2E270JX01D_C5119321.html
footprint CAP-0805 (0805 (2012M) Capacitor)
pins: 1, 2

## GCM21A5C2E470JX01D
designator C?  Capacitance: 47pF  (hidden comment: *)
Capacitor, Ceramic (MLCC), 47pF, ±5%, 250V, ±5%, SMD 0805; Manufacturer: Murata Electronics; Manufacturer Part Number: GCM21A5C2E470JX01D; Package Size: 0805; JLCPCB Basic Part: No; JLCPCB Part Number: C440149; Supplier 1: LCSC; Category: Capacitors - MLCC; Supplier Part Number 1: C440149; Tolerance: ±5%; Voltage Rating: 250V; RoHS: Yes; ComponentLink1Description: Datasheet; ComponentLink1URL: https://wmsc.lcsc.com/wmsc/upload/file/pdf/v2/lcsc/2304140030_Murata-Electronics-GCM21A5C2E470JX01D_C440149.pdf; ComponentLink2Description: JLCPCB Part URL; ComponentLink2URL: https://jlcpcb.com/partdetail/C440149; ComponentLink3Description: LCSC Part URL; ComponentLink3URL: https://lcsc.com/product-detail/Multilayer-Ceramic-Capacitors-MLCC---SMD-SMT_Murata-Electronics-Murata-Electronics-GCM21A5C2E470JX01D_C440149.html
footprint CAP-0805 (0805 (2012M) Capacitor)
pins: 1, 2

## GCM21A5C2E681JX01D
designator C?  Capacitance: 680pF  (hidden comment: *)
Capacitor, Ceramic (MLCC), 680pF, ±5%, ±5%, SMD 0805; Manufacturer: Murata Electronics; Manufacturer Part Number: GCM21A5C2E681JX01D; Package Size: 0805; JLCPCB Basic Part: No; JLCPCB Part Number: C909833; Supplier 1: LCSC; Category: Capacitors - MLCC; Supplier Part Number 1: C909833; Tolerance: ±5%; RoHS: Yes; ComponentLink1Description: Datasheet; ComponentLink1URL: https://wmsc.lcsc.com/wmsc/upload/file/pdf/v2/lcsc/2304140030_Murata-Electronics-GCM21A5C2E681JX01D_C909833.pdf; ComponentLink2Description: JLCPCB Part URL; ComponentLink2URL: https://jlcpcb.com/partdetail/C909833; ComponentLink3Description: LCSC Part URL; ComponentLink3URL: https://lcsc.com/product-detail/Multilayer-Ceramic-Capacitors-MLCC---SMD-SMT_Murata-Electronics-Murata-Electronics-GCM21A5C2E681JX01D_C909833.html
footprint CAP-0805 (0805 (2012M) Capacitor)
pins: 1, 2

## GCM21A7U2E101JX01D
designator C?  Capacitance: 100pF  (hidden comment: *)
Capacitor, Ceramic (MLCC), 100pF, ±5%, 250V, ±5%, SMD 0805; Manufacturer: Murata Electronics; Manufacturer Part Number: GCM21A7U2E101JX01D; Package Size: 0805; JLCPCB Basic Part: No; JLCPCB Part Number: C437488; Supplier 1: LCSC; Category: Capacitors - MLCC; Supplier Part Number 1: C437488; Tolerance: ±5%; Voltage Rating: 250V; RoHS: Yes; ComponentLink1Description: Datasheet; ComponentLink1URL: https://wmsc.lcsc.com/wmsc/upload/file/pdf/v2/lcsc/2304140030_Murata-Electronics-GCM21A7U2E101JX01D_C437488.pdf; ComponentLink2Description: JLCPCB Part URL; ComponentLink2URL: https://jlcpcb.com/partdetail/C437488; ComponentLink3Description: LCSC Part URL; ComponentLink3URL: https://lcsc.com/product-detail/Multilayer-Ceramic-Capacitors-MLCC---SMD-SMT_Murata-Electronics-Murata-Electronics-GCM21A7U2E101JX01D_C437488.html
footprint CAP-0805 (0805 (2012M) Capacitor)
pins: 1, 2

## GCM21A7U2E221JX01D
designator C?  Capacitance: 220pF  (hidden comment: *)
Capacitor, Ceramic (MLCC), 220pF, ±5%, 250V, U2J, ±5%, SMD 0805; Manufacturer: Murata Electronics; Manufacturer Part Number: GCM21A7U2E221JX01D; Package Size: 0805; JLCPCB Basic Part: No; JLCPCB Part Number: C440150; Supplier 1: LCSC; Category: Capacitors - MLCC; Supplier Part Number 1: C440150; Tolerance: ±5%; Voltage Rating: 250V; Temperature Coefficient: U2J; RoHS: Yes; ComponentLink1Description: Datasheet; ComponentLink1URL: https://wmsc.lcsc.com/wmsc/upload/file/pdf/v2/lcsc/2304140030_Murata-Electronics-GCM21A7U2E221JX01D_C440150.pdf; ComponentLink2Description: JLCPCB Part URL; ComponentLink2URL: https://jlcpcb.com/partdetail/C440150; ComponentLink3Description: LCSC Part URL; ComponentLink3URL: https://lcsc.com/product-detail/Multilayer-Ceramic-Capacitors-MLCC---SMD-SMT_Murata-Electronics-Murata-Electronics-GCM21A7U2E221JX01D_C440150.html
footprint CAP-0805 (0805 (2012M) Capacitor)
pins: 1, 2

## GCM21A7U2E471JX01D
designator C?  Capacitance: 470pF  (hidden comment: *)
Capacitor, Ceramic (MLCC), 470pF, ±5%, 250V, U2J, ±5%, SMD 0805; Manufacturer: Murata Electronics; Manufacturer Part Number: GCM21A7U2E471JX01D; Package Size: 0805; JLCPCB Basic Part: No; JLCPCB Part Number: C417152; Supplier 1: LCSC; Category: Capacitors - MLCC; Supplier Part Number 1: C417152; Tolerance: ±5%; Voltage Rating: 250V; Temperature Coefficient: U2J; RoHS: Yes; ComponentLink1Description: Datasheet; ComponentLink1URL: https://wmsc.lcsc.com/wmsc/upload/file/pdf/v2/lcsc/2201242200_Murata-Electronics-GCM21A7U2E471JX01D_C417152.pdf; ComponentLink2Description: JLCPCB Part URL; ComponentLink2URL: https://jlcpcb.com/partdetail/C417152; ComponentLink3Description: LCSC Part URL; ComponentLink3URL: https://lcsc.com/product-detail/Multilayer-Ceramic-Capacitors-MLCC---SMD-SMT_Murata-Electronics-Murata-Electronics-GCM21A7U2E471JX01D_C417152.html
footprint CAP-0805 (0805 (2012M) Capacitor)
pins: 1, 2

## GCM21B5C1H223JA16L
designator C?  Capacitance: 22nF  (hidden comment: *)
Capacitor, Ceramic (MLCC), 22nF, ±5%, 50V, C0G, ±5%, SMD 0805; Manufacturer: Murata Electronics; Manufacturer Part Number: GCM21B5C1H223JA16L; Package Size: 0805; JLCPCB Basic Part: No; JLCPCB Part Number: C161257; Supplier 1: LCSC; Category: Capacitors - MLCC; Supplier Part Number 1: C161257; Tolerance: ±5%; Voltage Rating: 50V; Temperature Coefficient: C0G; RoHS: Yes; ComponentLink1Description: Datasheet; ComponentLink1URL: https://wmsc.lcsc.com/wmsc/upload/file/pdf/v2/lcsc/1810201331_Murata-Electronics-GCM21B5C1H223JA16L_C161257.pdf; ComponentLink2Description: JLCPCB Part URL; ComponentLink2URL: https://jlcpcb.com/partdetail/C161257; ComponentLink3Description: LCSC Part URL; ComponentLink3URL: https://lcsc.com/product-detail/Multilayer-Ceramic-Capacitors-MLCC---SMD-SMT_Murata-Electronics-Murata-Electronics-GCM21B5C1H223JA16L_C161257.html
footprint CAP-0805 (0805 (2012M) Capacitor)
pins: 1, 2

## GCM21B5C2E472JX01L
designator C?  Capacitance: 4.7nF  (hidden comment: *)
Capacitor, Ceramic (MLCC), 4.7nF, ±5%, 250V, C0G, ±5%, SMD 0805; Manufacturer: Murata Electronics; Manufacturer Part Number: GCM21B5C2E472JX01L; Package Size: 0805; JLCPCB Basic Part: No; JLCPCB Part Number: C415370; Supplier 1: LCSC; Category: Capacitors - MLCC; Supplier Part Number 1: C415370; Tolerance: ±5%; Voltage Rating: 250V; Temperature Coefficient: C0G; RoHS: Yes; ComponentLink1Description: Datasheet; ComponentLink1URL: https://wmsc.lcsc.com/wmsc/upload/file/pdf/v2/lcsc/1912111437_Murata-Electronics-GCM21B5C2E472JX01L_C415370.pdf; ComponentLink2Description: JLCPCB Part URL; ComponentLink2URL: https://jlcpcb.com/partdetail/C415370; ComponentLink3Description: LCSC Part URL; ComponentLink3URL: https://lcsc.com/product-detail/Multilayer-Ceramic-Capacitors-MLCC---SMD-SMT_Murata-Electronics-Murata-Electronics-GCM21B5C2E472JX01L_C415370.html
footprint CAP-0805 (0805 (2012M) Capacitor)
pins: 1, 2

## GCM21BC7YA225KE02L
designator C?  Capacitance: 2.2uF  (hidden comment: *)
Capacitor, Ceramic (MLCC), 2.2uF, ±10%, 35V, X7S, ±10%, SMD 0805; Manufacturer: Murata Electronics; Manufacturer Part Number: GCM21BC7YA225KE02L; Package Size: 0805; JLCPCB Basic Part: No; JLCPCB Part Number: C389007; Supplier 1: LCSC; Category: Capacitors - MLCC; Supplier Part Number 1: C389007; Tolerance: ±10%; Voltage Rating: 35V; Temperature Coefficient: X7S; RoHS: Yes; ComponentLink1Description: Datasheet; ComponentLink1URL: https://wmsc.lcsc.com/wmsc/upload/file/pdf/v2/lcsc/1912111437_Murata-Electronics-GCM21BC7YA225KE02L_C389007.pdf; ComponentLink2Description: JLCPCB Part URL; ComponentLink2URL: https://jlcpcb.com/partdetail/C389007; ComponentLink3Description: LCSC Part URL; ComponentLink3URL: https://lcsc.com/product-detail/Multilayer-Ceramic-Capacitors-MLCC---SMD-SMT_Murata-Electronics-Murata-Electronics-GCM21BC7YA225KE02L_C389007.html
footprint CAP-0805 (0805 (2012M) Capacitor)
pins: 1, 2

## GCM21BC7YA475KE36L
designator C?  Capacitance: 4.7uF  (hidden comment: *)
Capacitor, Ceramic (MLCC), 4.7uF, ±10%, 35V, X7S, ±10%, SMD 0805; Manufacturer: Murata Electronics; Manufacturer Part Number: GCM21BC7YA475KE36L; Package Size: 0805; JLCPCB Basic Part: No; JLCPCB Part Number: C408555; Supplier 1: LCSC; Category: Capacitors - MLCC; Supplier Part Number 1: C408555; Tolerance: ±10%; Voltage Rating: 35V; Temperature Coefficient: X7S; RoHS: Yes; ComponentLink1Description: Datasheet; ComponentLink1URL: https://wmsc.lcsc.com/wmsc/upload/file/pdf/v2/lcsc/1912111437_Murata-Electronics-GCM21BC7YA475KE36L_C408555.pdf; ComponentLink2Description: JLCPCB Part URL; ComponentLink2URL: https://jlcpcb.com/partdetail/C408555; ComponentLink3Description: LCSC Part URL; ComponentLink3URL: https://lcsc.com/product-detail/Multilayer-Ceramic-Capacitors-MLCC---SMD-SMT_Murata-Electronics-Murata-Electronics-GCM21BC7YA475KE36L_C408555.html
footprint CAP-0805 (0805 (2012M) Capacitor)
pins: 1, 2

## GCM21BC7YA475ME36L
designator C?  Capacitance: 4.7uF  (hidden comment: *)
Capacitor, Ceramic (MLCC), 4.7uF, ±20%, 35V, X7S, ±20%, SMD 0805; Manufacturer: Murata Electronics; Manufacturer Part Number: GCM21BC7YA475ME36L; Package Size: 0805; JLCPCB Basic Part: No; JLCPCB Part Number: C710698; Supplier 1: LCSC; Category: Capacitors - MLCC; Supplier Part Number 1: C710698; Tolerance: ±20%; Voltage Rating: 35V; Temperature Coefficient: X7S; RoHS: Yes; ComponentLink1Description: Datasheet; ComponentLink1URL: https://wmsc.lcsc.com/wmsc/upload/file/pdf/v2/lcsc/2205101700_Murata-Electronics-GCM21BC7YA475ME36L_C710698.pdf; ComponentLink2Description: JLCPCB Part URL; ComponentLink2URL: https://jlcpcb.com/partdetail/C710698; ComponentLink3Description: LCSC Part URL; ComponentLink3URL: https://lcsc.com/product-detail/Multilayer-Ceramic-Capacitors-MLCC---SMD-SMT_Murata-Electronics-Murata-Electronics-GCM21BC7YA475ME36L_C710698.html
footprint CAP-0805 (0805 (2012M) Capacitor)
pins: 1, 2

## GCM21BC71A475KA73L
designator C?  Capacitance: 4.7uF  (hidden comment: *)
Capacitor, Ceramic (MLCC), 4.7uF, ±10%, 10V, X7S, ±10%, SMD 0805; Manufacturer: Murata Electronics; Manufacturer Part Number: GCM21BC71A475KA73L; Package Size: 0805; JLCPCB Basic Part: No; JLCPCB Part Number: C126583; Supplier 1: LCSC; Category: Capacitors - MLCC; Supplier Part Number 1: C126583; Tolerance: ±10%; Voltage Rating: 10V; Temperature Coefficient: X7S; RoHS: Yes; ComponentLink1Description: Datasheet; ComponentLink1URL: https://wmsc.lcsc.com/wmsc/upload/file/pdf/v2/lcsc/1912111437_Murata-Electronics-GCM21BC71A475KA73L_C126583.pdf; ComponentLink2Description: JLCPCB Part URL; ComponentLink2URL: https://jlcpcb.com/partdetail/C126583; ComponentLink3Description: LCSC Part URL; ComponentLink3URL: https://lcsc.com/product-detail/Multilayer-Ceramic-Capacitors-MLCC---SMD-SMT_Murata-Electronics-Murata-Electronics-GCM21BC71A475KA73L_C126583.html
footprint CAP-0805 (0805 (2012M) Capacitor)
pins: 1, 2

## GCM21BC71C106KE36L
designator C?  Capacitance: 10uF  (hidden comment: *)
Capacitor, Ceramic (MLCC), 10uF, ±10%, 16V, X7S, ±10%, SMD 0805; Manufacturer: Murata Electronics; Manufacturer Part Number: GCM21BC71C106KE36L; Package Size: 0805; JLCPCB Basic Part: No; JLCPCB Part Number: C126584; Supplier 1: LCSC; Category: Capacitors - MLCC; Supplier Part Number 1: C126584; Tolerance: ±10%; Voltage Rating: 16V; Temperature Coefficient: X7S; RoHS: Yes; ComponentLink1Description: Datasheet; ComponentLink1URL: https://wmsc.lcsc.com/wmsc/upload/file/pdf/v2/lcsc/1811141815_Murata-Electronics-GCM21BC71C106KE36L_C126584.pdf; ComponentLink2Description: JLCPCB Part URL; ComponentLink2URL: https://jlcpcb.com/partdetail/C126584; ComponentLink3Description: LCSC Part URL; ComponentLink3URL: https://lcsc.com/product-detail/Multilayer-Ceramic-Capacitors-MLCC---SMD-SMT_Murata-Electronics-Murata-Electronics-GCM21BC71C106KE36L_C126584.html
footprint CAP-0805 (0805 (2012M) Capacitor)
pins: 1, 2

## GCM21BC71E475KE36L
designator C?  Capacitance: 4.7uF  (hidden comment: *)
Capacitor, Ceramic (MLCC), 4.7uF, ±10%, 25V, X7S, ±10%, SMD 0805; Manufacturer: Murata Electronics; Manufacturer Part Number: GCM21BC71E475KE36L; Package Size: 0805; JLCPCB Basic Part: No; JLCPCB Part Number: C469525; Supplier 1: LCSC; Category: Capacitors - MLCC; Supplier Part Number 1: C469525; Tolerance: ±10%; Voltage Rating: 25V; Temperature Coefficient: X7S; RoHS: Yes; ComponentLink1Description: Datasheet; ComponentLink1URL: https://wmsc.lcsc.com/wmsc/upload/file/pdf/v2/lcsc/2011121334_Murata-Electronics-GCM21BC71E475KE36L_C469525.pdf; ComponentLink2Description: JLCPCB Part URL; ComponentLink2URL: https://jlcpcb.com/partdetail/C469525; ComponentLink3Description: LCSC Part URL; ComponentLink3URL: https://lcsc.com/product-detail/Multilayer-Ceramic-Capacitors-MLCC---SMD-SMT_Murata-Electronics-Murata-Electronics-GCM21BC71E475KE36L_C469525.html
footprint CAP-0805 (0805 (2012M) Capacitor)
pins: 1, 2

## GCM21BC71E475ME36L
designator C?  Capacitance: 4.7uF  (hidden comment: *)
Capacitor, Ceramic (MLCC), 4.7uF, ±20%, 25V, X7S, ±20%, SMD 0805; Manufacturer: Murata Electronics; Manufacturer Part Number: GCM21BC71E475ME36L; Package Size: 0805; JLCPCB Basic Part: No; JLCPCB Part Number: C2994783; Supplier 1: LCSC; Category: Capacitors - MLCC; Supplier Part Number 1: C2994783; Tolerance: ±20%; Voltage Rating: 25V; Temperature Coefficient: X7S; RoHS: Yes; ComponentLink1Description: Datasheet; ComponentLink1URL: https://wmsc.lcsc.com/wmsc/upload/file/pdf/v2/lcsc/2204111815_Murata-Electronics-GCM21BC71E475ME36L_C2994783.pdf; ComponentLink2Description: JLCPCB Part URL; ComponentLink2URL: https://jlcpcb.com/partdetail/C2994783; ComponentLink3Description: LCSC Part URL; ComponentLink3URL: https://lcsc.com/product-detail/Multilayer-Ceramic-Capacitors-MLCC---SMD-SMT_Murata-Electronics-Murata-Electronics-GCM21BC71E475ME36L_C2994783.html
footprint CAP-0805 (0805 (2012M) Capacitor)
pins: 1, 2
